# Altium footprint library FS_Footprints.PcbLib: 134 footprints (part 9 of 9)
Each footprint in its own frame and in the unit in brackets; x right, y up, seen from the top. Pads: shape width x height; smd on the part's side, far side on the other; paste and mask are expansions set on the pad; w line width, h text height; cw(c..) or ccw(c..) is an arc to the next point about the centre after c.
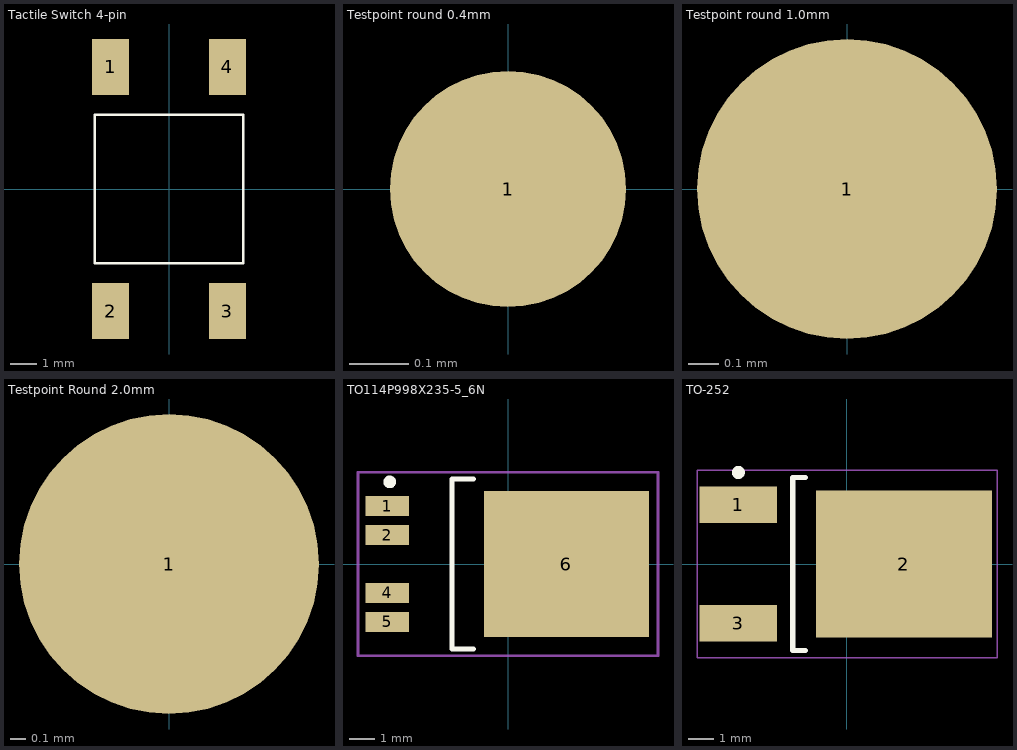
[diagram p8: the footprints below, top view; thin cyan lines are the x and y axes]

## Tactile Switch 4-pin [mm]
pads (4):
  rect 1.4x2.1 smd: 1(-2.2,4.6) 2(-2.2,-4.6) 3(2.2,-4.6) 4(2.2,4.6)
Top Overlay:
  lines w0.1: -2.794,-2.794 2.794,-2.794 2.794,2.794 -2.794,2.794 -2.794,-2.794
3D body "User Library-FSM4JSMATR - TE Connectivity - SPST 6mm Tactile Switch.step": height 5.07, standoff 0.1, extent -3,-5 3,5

## Testpoint round 0.4mm [mm]
pads (1):
  round 0.4 smd: 1(0,0)

## Testpoint round 1.0mm [mm]
pads (1):
  round 1 smd: 1(0,0)

## Testpoint Round 2.0mm [mm]
pads (1):
  round 2 smd: 1(0,0)

## TO114P998X235-5_6N [mm] "TO,1.14mm pitch;5 pin,9.98mm L X 6.22mm W X 2.35mm H body"
height 2.35
pads (5):
  rect 1.7x0.8 smd: 1(-4.75,2.28) 2(-4.75,1.14) 4(-4.75,-1.14) 5(-4.75,-2.28)
  rect 6.5x5.75 smd: 6(2.3,0)
Top Overlay:
  circle w0.25: c-4.65,3.23 r0.125
  lines w0.2: -1.35,-3.35 -2.2,-3.35 -2.2,3.35 -1.35,3.35
Top Paste:
  region: 3.38,0.33 4.96,0.33 4.96,2.21 3.38,2.21
  region: 1.14,0.33 2.72,0.33 2.72,2.21 1.14,2.21
  region: 3.38,-2.21 4.96,-2.21 4.96,-0.33 3.38,-0.33
  region: 1.14,-2.21 2.72,-2.21 2.72,-0.33 1.14,-0.33
Mechanical 15:
  lines w0.1: -0.5,0 0.5,0 ; 0,-0.5 0,0.5 ; -5.9,-3.6 -5.9,3.6 5.9,3.6 5.9,-3.6 -5.9,-3.6
3D body "TO252-5-11.stp": height 2.36, standoff 0, extent -4.99,-3.25 4.99,3.25

## TO-252 [mm] "D-PAK, 3-Pads, Body 6.21x6.73mm (max), IPC Medium Density"
height 2.39
pads (3):
  rect 3x1.4 smd: 1(-4.2,2.29) 3(-4.2,-2.29)
  rect 6.8x5.7 smd: 2(2.2,0)
Top Overlay:
  circle w0.25: c-4.2,3.54 r0.125
  lines w0.2: -1.6,-3.35 -2.1,-3.35 -2.1,3.35 -1.6,3.35
Mechanical 15:
  lines w0.05: -5.8,-3.625 -5.8,3.625 5.8,3.625 5.8,-3.625 -5.8,-3.625
  lines w0.1: -0.5,0 0.5,0 ; 0,-0.5 0,0.5
3D body "TO-252.step": height 2.39, standoff 0, extent -3.94,-3.375 5.965,3.375